# Altium integrated library connecteur 4.IntLib: 120 symbols
Pins are listed as number, name and electrical type; pins without a type are passive.

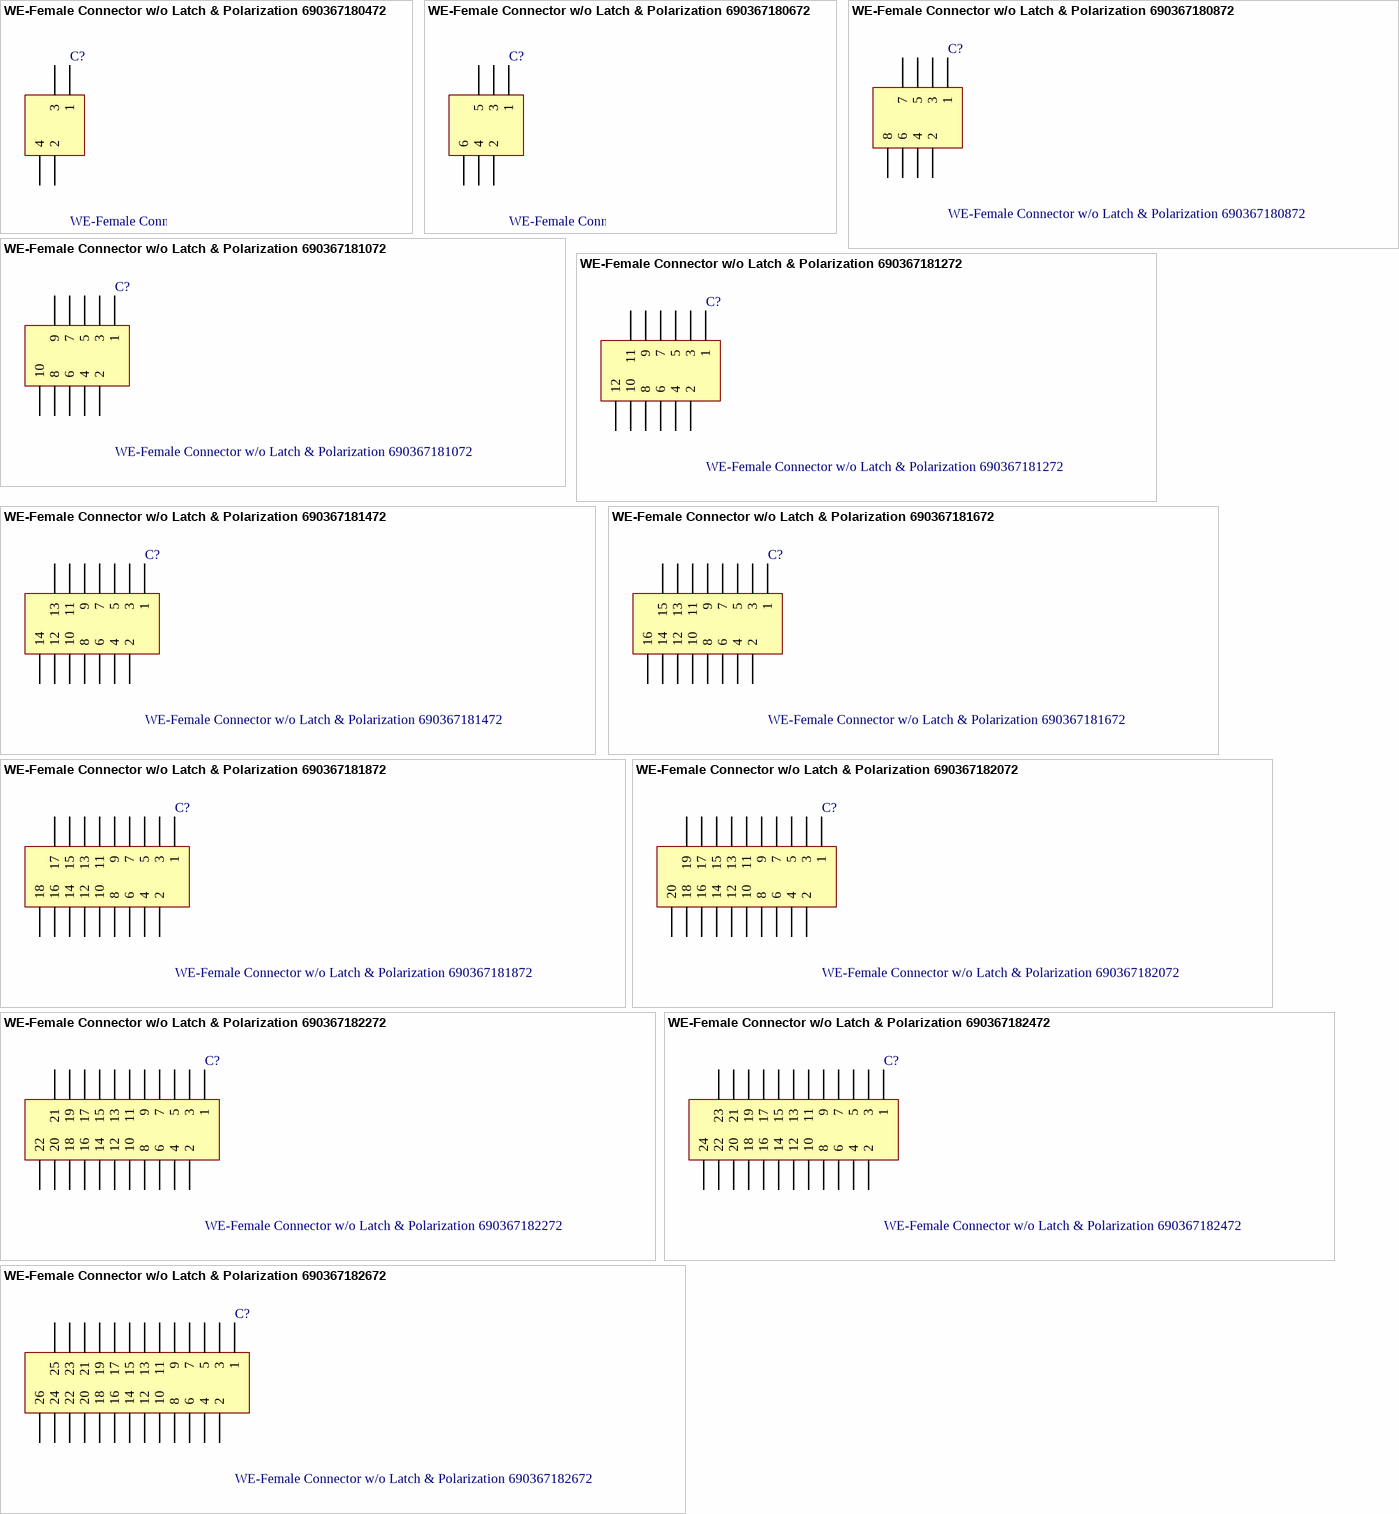
[diagram p0: symbols WE-Female Connector w/o Latch & Polarization 690367180472 to WE-Female Connector w/o Latch & Polarization 690367182672]

## WE-Female Connector w/o Latch & Polarization 690367180472
designator C?
WR-MM Female Connector w/o Latch & Polarization; Manufacturer: Würth Elektronik eiSos GmbH; ComponentLink1 Description: Manufacturer; ComponentLink2 Description: Datasheet; NoPins: 4; Created Date: 17 April 2013; partNo: 690367180472; ComponentLink1URL: http://www.we-online.com; ComponentLink2URL: http://katalog.we-online.de/em/datasheet/69036718xx72.pdf; Created by: Karrer Zheng
footprint 690367180472 (4 pins, straight)
pins: 1, 2, 3, 4

## WE-Female Connector w/o Latch & Polarization 690367180672
designator C?
WR-MM Female Connector w/o Latch & Polarization; Manufacturer: Würth Elektronik eiSos GmbH; ComponentLink1 Description: Manufacturer; ComponentLink2 Description: Datasheet; NoPins: 6; Created Date: 17 April 2013; partNo: 690367180672; ComponentLink1URL: http://www.we-online.com; ComponentLink2URL: http://katalog.we-online.de/em/datasheet/69036718xx72.pdf; Created by: Karrer Zheng
footprint 690367180672 (6 pins, straight)
pins: 1, 2, 3, 4, 5, 6

## WE-Female Connector w/o Latch & Polarization 690367180872
designator C?
WR-MM Female Connector w/o Latch & Polarization; Manufacturer: Würth Elektronik eiSos GmbH; ComponentLink1 Description: Manufacturer; ComponentLink2 Description: Datasheet; NoPins: 8; Created Date: 17 April 2013; partNo: 690367180872; ComponentLink1URL: http://www.we-online.com; ComponentLink2URL: http://katalog.we-online.de/em/datasheet/69036718xx72.pdf; Created by: Karrer Zheng
footprint 690367180872 (8 pins, straight)
pins: 1, 2, 3, 4, 5, 6, 7, 8

## WE-Female Connector w/o Latch & Polarization 690367181072
designator C?
WR-MM Female Connector w/o Latch & Polarization; Manufacturer: Würth Elektronik eiSos GmbH; ComponentLink1 Description: Manufacturer; ComponentLink2 Description: Datasheet; NoPins: 10; Created Date: 17 April 2013; partNo: 690367181072; ComponentLink1URL: http://www.we-online.com; ComponentLink2URL: http://katalog.we-online.de/em/datasheet/69036718xx72.pdf; Created by: Karrer Zheng
footprint 690367181072 (10 pins, straight)
pins: 1, 2, 3, 4, 5, 6, 7, 8, 9, 10

## WE-Female Connector w/o Latch & Polarization 690367181272
designator C?
WR-MM Female Connector w/o Latch & Polarization; Manufacturer: Würth Elektronik eiSos GmbH; ComponentLink1 Description: Manufacturer; ComponentLink2 Description: Datasheet; NoPins: 12; Created Date: 17 April 2013; partNo: 690367181272; ComponentLink1URL: http://www.we-online.com; ComponentLink2URL: http://katalog.we-online.de/em/datasheet/69036718xx72.pdf; Created by: Karrer Zheng
footprint 690367181272 (12 pins, straight)
pins: 1, 2, 3, 4, 5, 6, 7, 8, 9, 10, 11, 12

## WE-Female Connector w/o Latch & Polarization 690367181472
designator C?
WR-MM Female Connector w/o Latch & Polarization; Manufacturer: Würth Elektronik eiSos GmbH; ComponentLink1 Description: Manufacturer; ComponentLink2 Description: Datasheet; NoPins: 14; Created Date: 17 April 2013; partNo: 690367181472; ComponentLink1URL: http://www.we-online.com; ComponentLink2URL: http://katalog.we-online.de/em/datasheet/69036718xx72.pdf; Created by: Karrer Zheng
footprint 690367181472 (14 pins, straight)
pins: 1, 2, 3, 4, 5, 6, 7, 8, 9, 10, 11, 12, 13, 14

## WE-Female Connector w/o Latch & Polarization 690367181672
designator C?
WR-MM Female Connector w/o Latch & Polarization; Manufacturer: Würth Elektronik eiSos GmbH; ComponentLink1 Description: Manufacturer; ComponentLink2 Description: Datasheet; NoPins: 16; Created Date: 17 April 2013; partNo: 690367181672; ComponentLink1URL: http://www.we-online.com; ComponentLink2URL: http://katalog.we-online.de/em/datasheet/69036718xx72.pdf; Created by: Karrer Zheng
footprint 690367181672 (16 pins, straight)
pins: 1, 2, 3, 4, 5, 6, 7, 8, 9, 10, 11, 12, 13, 14, 15, 16

## WE-Female Connector w/o Latch & Polarization 690367181872
designator C?
WR-MM Female Connector w/o Latch & Polarization; Manufacturer: Würth Elektronik eiSos GmbH; ComponentLink1 Description: Manufacturer; ComponentLink2 Description: Datasheet; NoPins: 18; Created Date: 17 April 2013; partNo: 690367181872; ComponentLink1URL: http://www.we-online.com; ComponentLink2URL: http://katalog.we-online.de/em/datasheet/69036718xx72.pdf; Created by: Karrer Zheng
footprint 690367181872 (18 pins, straight)
pins: 1, 2, 3, 4, 5, 6, 7, 8, 9, 10, 11, 12, 13, 14, 15, 16, 17, 18

## WE-Female Connector w/o Latch & Polarization 690367182072
designator C?
WR-MM Female Connector w/o Latch & Polarization; Manufacturer: Würth Elektronik eiSos GmbH; ComponentLink1 Description: Manufacturer; ComponentLink2 Description: Datasheet; NoPins: 20; Created Date: 17 April 2013; partNo: 690367182072; ComponentLink1URL: http://www.we-online.com; ComponentLink2URL: http://katalog.we-online.de/em/datasheet/69036718xx72.pdf; Created by: Karrer Zheng
footprint 690367182072 (20 pins, straight)
pins: 1, 2, 3, 4, 5, 6, 7, 8, 9, 10, 11, 12, 13, 14, 15, 16, 17, 18, 19, 20

## WE-Female Connector w/o Latch & Polarization 690367182272
designator C?
WR-MM Female Connector w/o Latch & Polarization; Manufacturer: Würth Elektronik eiSos GmbH; ComponentLink1 Description: Manufacturer; ComponentLink2 Description: Datasheet; NoPins: 22; Created Date: 17 April 2013; partNo: 690367182272; ComponentLink1URL: http://www.we-online.com; ComponentLink2URL: http://katalog.we-online.de/em/datasheet/69036718xx72.pdf; Created by: Karrer Zheng
footprint 690367182272 (22 pins, straight)
pins: 1, 2, 3, 4, 5, 6, 7, 8, 9, 10, 11, 12, 13, 14, 15, 16, 17, 18, 19, 20, 21, 22

## WE-Female Connector w/o Latch & Polarization 690367182472
designator C?
WR-MM Female Connector w/o Latch & Polarization; Manufacturer: Würth Elektronik eiSos GmbH; ComponentLink1 Description: Manufacturer; ComponentLink2 Description: Datasheet; NoPins: 24; Created Date: 17 April 2013; partNo: 690367182472; ComponentLink1URL: http://www.we-online.com; ComponentLink2URL: http://katalog.we-online.de/em/datasheet/69036718xx72.pdf; Created by: Karrer Zheng
footprint 690367182472 (24 pins, straight)
pins: 1, 2, 3, 4, 5, 6, 7, 8, 9, 10, 11, 12, 13, 14, 15, 16, 17, 18, 19, 20, 21, 22, 23, 24

## WE-Female Connector w/o Latch & Polarization 690367182672
designator C?
WR-MM Female Connector w/o Latch & Polarization; Manufacturer: Würth Elektronik eiSos GmbH; ComponentLink1 Description: Manufacturer; ComponentLink2 Description: Datasheet; NoPins: 26; Created Date: 17 April 2013; partNo: 690367182672; ComponentLink1URL: http://www.we-online.com; ComponentLink2URL: http://katalog.we-online.de/em/datasheet/69036718xx72.pdf; Created by: Karrer Zheng
footprint 690367182672 (26 pins, straight)
pins: 1, 2, 3, 4, 5, 6, 7, 8, 9, 10, 11, 12, 13, 14, 15, 16, 17, 18, 19, 20, 21, 22, 23, 24, 25, 26


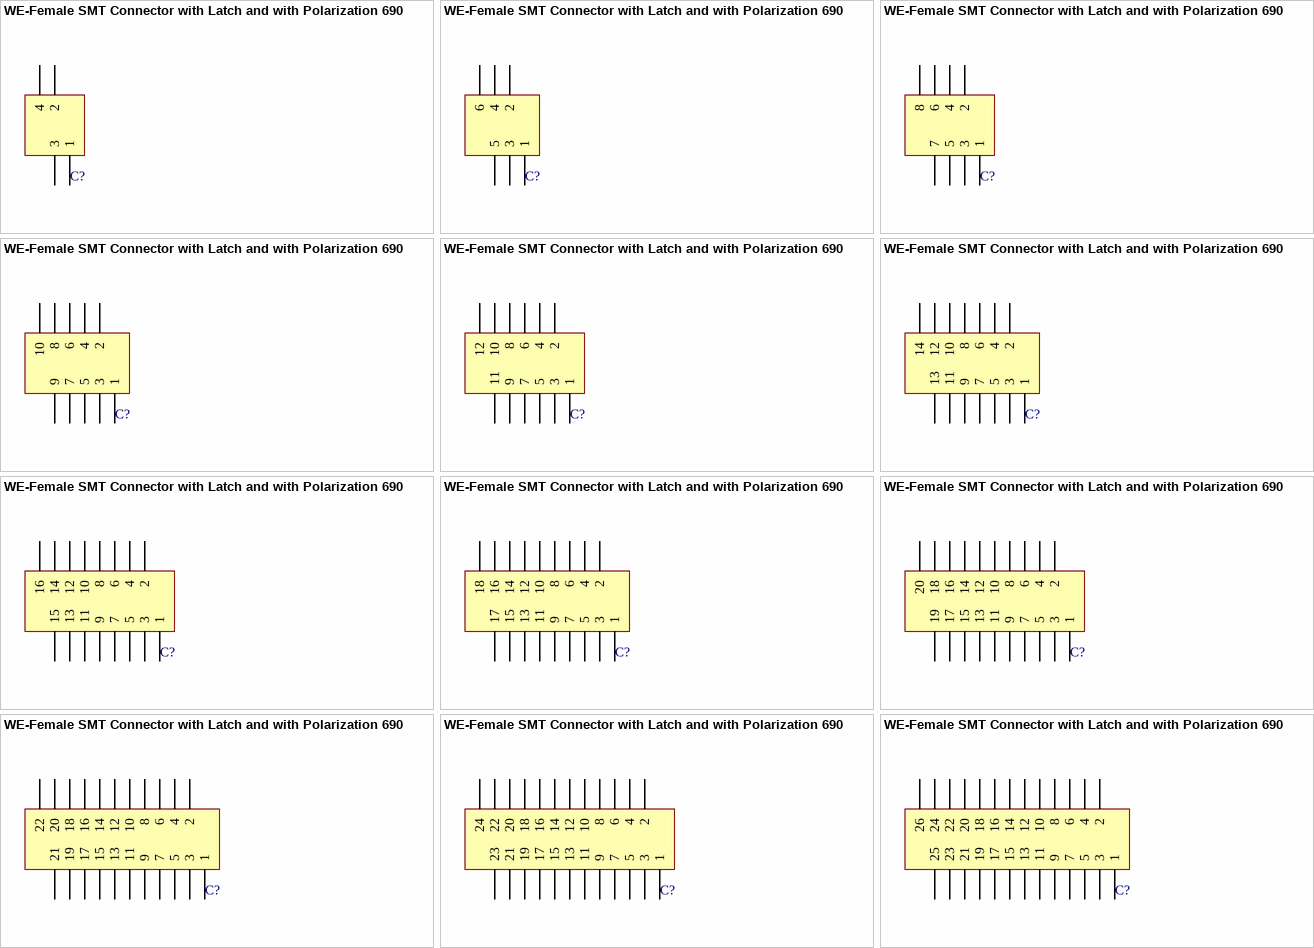
[diagram p1: symbols WE-Female SMT Connector with Latch and with Polarization 690367290476 to WE-Female SMT Connector with Latch and with Polarization 690367292676]

## WE-Female SMT Connector with Latch and with Polarization 690367290476
designator C?
WR-MM Female SMT Connector with Latch; Manufacturer: Würth Elektronik eiSos GmbH; ComponentLink1 Description: Manufacturer; ComponentLink2 Description: Datasheet; NoPins: 4; Created Date: 16 April 2013; partNo: 690367290476; ComponentLink1URL: http://www.we-online.com; ComponentLink2URL: http://katalog.we-online.de/em/datasheet/69036729xx76.pdf; Created by: Karrer Zheng
footprint 690367290476 (and Polarization, 4 pins, SMT, straight)
pins: 1, 2, 3, 4

## WE-Female SMT Connector with Latch and with Polarization 690367290676
designator C?
WR-MM Female SMT Connector with Latch; Manufacturer: Würth Elektronik eiSos GmbH; ComponentLink1 Description: Manufacturer; ComponentLink2 Description: Datasheet; NoPins: 06; Created Date: 16 April 2013; partNo: 690367290676; ComponentLink1URL: http://www.we-online.com; ComponentLink2URL: http://katalog.we-online.de/em/datasheet/69036729xx76.pdf; Created by: Karrer Zheng
footprint 690367290676 (and Polarization, 6 pins, SMT, straight)
pins: 1, 2, 3, 4, 5, 6

## WE-Female SMT Connector with Latch and with Polarization 690367290876
designator C?
WR-MM Female SMT Connector with Latch; Manufacturer: Würth Elektronik eiSos GmbH; ComponentLink1 Description: Manufacturer; ComponentLink2 Description: Datasheet; NoPins: 08; Created Date: 16 April 2013; partNo: 690367290876; ComponentLink1URL: http://www.we-online.com; ComponentLink2URL: http://katalog.we-online.de/em/datasheet/69036729xx76.pdf; Created by: Karrer Zheng
footprint 690367290876 (and Polarization, 8 pins, SMT, straight)
pins: 1, 2, 3, 4, 5, 6, 7, 8

## WE-Female SMT Connector with Latch and with Polarization 690367291076
designator C?
WR-MM Female SMT Connector with Latch; Manufacturer: Würth Elektronik eiSos GmbH; ComponentLink1 Description: Manufacturer; ComponentLink2 Description: Datasheet; NoPins: 10; Created Date: 16 April 2013; partNo: 690367291076; ComponentLink1URL: http://www.we-online.com; ComponentLink2URL: http://katalog.we-online.de/em/datasheet/69036729xx76.pdf; Created by: Karrer Zheng
footprint 690367291076 (and Polarization, 10 pins, SMT, straight)
pins: 1, 2, 3, 4, 5, 6, 7, 8, 9, 10

## WE-Female SMT Connector with Latch and with Polarization 690367291276
designator C?
WR-MM Female SMT Connector with Latch; Manufacturer: Würth Elektronik eiSos GmbH; ComponentLink1 Description: Manufacturer; ComponentLink2 Description: Datasheet; NoPins: 12; Created Date: 16 April 2013; partNo: 690367291276; ComponentLink1URL: http://www.we-online.com; ComponentLink2URL: http://katalog.we-online.de/em/datasheet/69036729xx76.pdf; Created by: Karrer Zheng
footprint 690367291276 (and Polarization, 12 pins, SMT, straight)
pins: 1, 2, 3, 4, 5, 6, 7, 8, 9, 10, 11, 12

## WE-Female SMT Connector with Latch and with Polarization 690367291476
designator C?
WR-MM Female SMT Connector with Latch; Manufacturer: Würth Elektronik eiSos GmbH; ComponentLink1 Description: Manufacturer; ComponentLink2 Description: Datasheet; NoPins: 14; Created Date: 16 April 2013; partNo: 690367291476; ComponentLink1URL: http://www.we-online.com; ComponentLink2URL: http://katalog.we-online.de/em/datasheet/69036729xx76.pdf; Created by: Karrer Zheng
footprint 690367291476 (and Polarization, 14 pins, SMT, straight)
pins: 1, 2, 3, 4, 5, 6, 7, 8, 9, 10, 11, 12, 13, 14

## WE-Female SMT Connector with Latch and with Polarization 690367291676
designator C?
WR-MM Female SMT Connector with Latch; Manufacturer: Würth Elektronik eiSos GmbH; ComponentLink1 Description: Manufacturer; ComponentLink2 Description: Datasheet; NoPins: 16; Created Date: 16 April 2013; partNo: 690367291676; ComponentLink1URL: http://www.we-online.com; ComponentLink2URL: http://katalog.we-online.de/em/datasheet/69036729xx76.pdf; Created by: Karrer Zheng
footprint 690367291676 (and Polarization, 16 pins, SMT, straight)
pins: 1, 2, 3, 4, 5, 6, 7, 8, 9, 10, 11, 12, 13, 14, 15, 16

## WE-Female SMT Connector with Latch and with Polarization 690367291876
designator C?
WR-MM Female SMT Connector with Latch; Manufacturer: Würth Elektronik eiSos GmbH; ComponentLink1 Description: Manufacturer; ComponentLink2 Description: Datasheet; NoPins: 18; Created Date: 16 April 2013; partNo: 690367291876; ComponentLink1URL: http://www.we-online.com; ComponentLink2URL: http://katalog.we-online.de/em/datasheet/69036729xx76.pdf; Created by: Karrer Zheng
footprint 690367291876 (and Polarization, 18 pins, SMT, straight)
pins: 1, 2, 3, 4, 5, 6, 7, 8, 9, 10, 11, 12, 13, 14, 15, 16, 17, 18

## WE-Female SMT Connector with Latch and with Polarization 690367292076
designator C?
WR-MM Female SMT Connector with Latch; Manufacturer: Würth Elektronik eiSos GmbH; ComponentLink1 Description: Manufacturer; ComponentLink2 Description: Datasheet; NoPins: 20; Created Date: 16 April 2013; partNo: 690367292076; ComponentLink1URL: http://www.we-online.com; ComponentLink2URL: http://katalog.we-online.de/em/datasheet/69036729xx76.pdf; Created by: Karrer Zheng
footprint 690367292076 (and Polarization, 20 pins, SMT, straight)
pins: 1, 2, 3, 4, 5, 6, 7, 8, 9, 10, 11, 12, 13, 14, 15, 16, 17, 18, 19, 20

## WE-Female SMT Connector with Latch and with Polarization 690367292276
designator C?
WR-MM Female SMT Connector with Latch; Manufacturer: Würth Elektronik eiSos GmbH; ComponentLink1 Description: Manufacturer; ComponentLink2 Description: Datasheet; NoPins: 22; Created Date: 16 April 2013; partNo: 690367292276; ComponentLink1URL: http://www.we-online.com; ComponentLink2URL: http://katalog.we-online.de/em/datasheet/69036729xx76.pdf; Created by: Karrer Zheng
footprint 690367292276 (and Polarization, 22 pins, SMT, straight)
pins: 1, 2, 3, 4, 5, 6, 7, 8, 9, 10, 11, 12, 13, 14, 15, 16, 17, 18, 19, 20, 21, 22

## WE-Female SMT Connector with Latch and with Polarization 690367292476
designator C?
WR-MM Female SMT Connector with Latch; Manufacturer: Würth Elektronik eiSos GmbH; ComponentLink1 Description: Manufacturer; ComponentLink2 Description: Datasheet; NoPins: 24; Created Date: 16 April 2013; partNo: 690367292476; ComponentLink1URL: http://www.we-online.com; ComponentLink2URL: http://katalog.we-online.de/em/datasheet/69036729xx76.pdf; Created by: Karrer Zheng
footprint 690367292476 (and Polarization, 24 pins, SMT, straight)
pins: 1, 2, 3, 4, 5, 6, 7, 8, 9, 10, 11, 12, 13, 14, 15, 16, 17, 18, 19, 20, 21, 22, 23, 24

## WE-Female SMT Connector with Latch and with Polarization 690367292676
designator C?
WR-MM Female SMT Connector with Latch; Manufacturer: Würth Elektronik eiSos GmbH; ComponentLink1 Description: Manufacturer; ComponentLink2 Description: Datasheet; NoPins: 26; Created Date: 16 April 2013; partNo: 690367292676; ComponentLink1URL: http://www.we-online.com; ComponentLink2URL: http://katalog.we-online.de/em/datasheet/69036729xx76.pdf; Created by: Karrer Zheng
footprint 690367292676 (and Polarization, 26 pins, SMT, straight)
pins: 1, 2, 3, 4, 5, 6, 7, 8, 9, 10, 11, 12, 13, 14, 15, 16, 17, 18, 19, 20, 21, 22, 23, 24, 25, 26


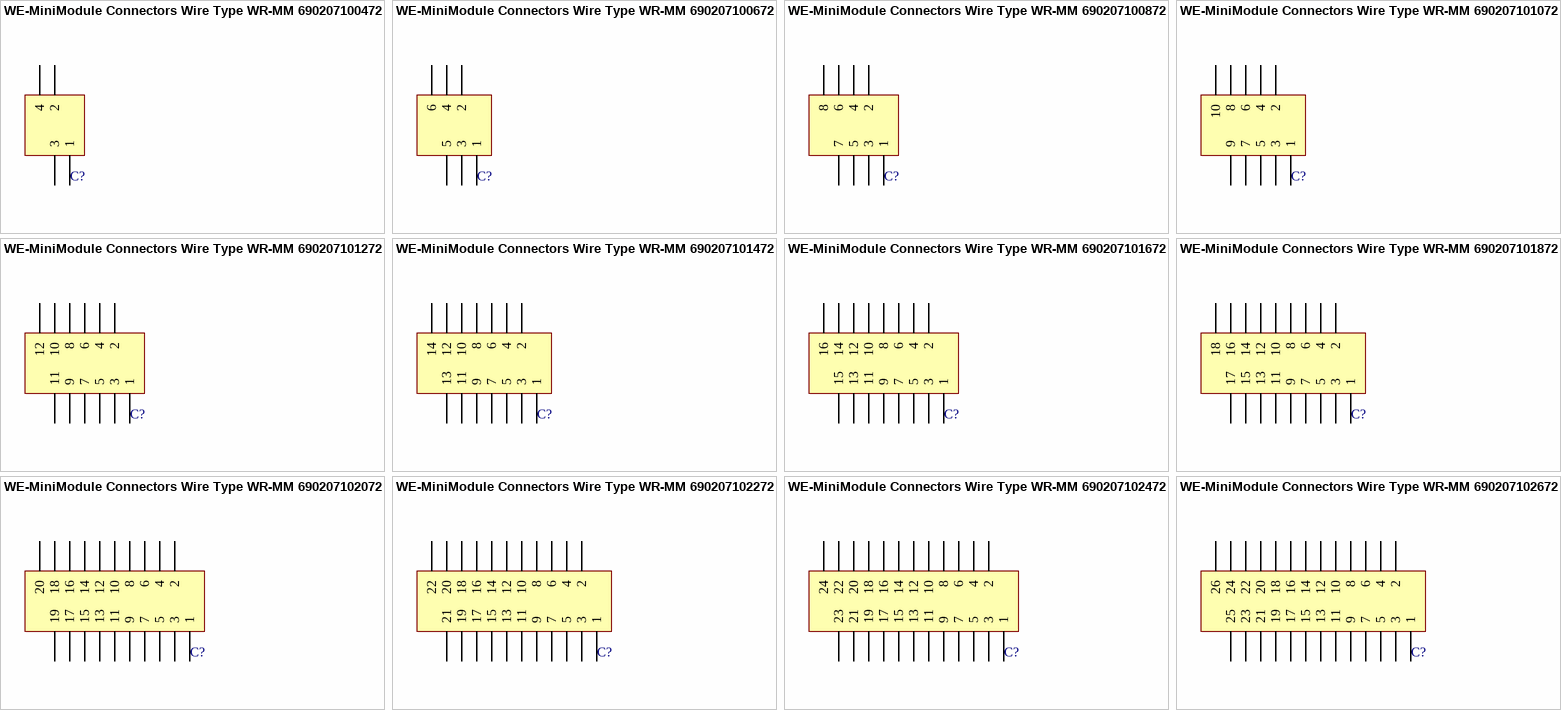
[diagram p2: symbols WE-MiniModule Connectors Wire Type WR-MM 690207100472 to WE-MiniModule Connectors Wire Type WR-MM 690207102672]

## WE-MiniModule Connectors Wire Type WR-MM 690207100472
designator C?
WR-MM Transition Connector; Manufacturer: Würth Elektronik eiSos GmbH; ComponentLink1 Description: Manufacturer; ComponentLink2 Description: Datasheet; NoPins: 4; Created Date: 19 April 2013; partNo: 690207100472; ComponentLink1URL: http://www.we-online.com; ComponentLink2URL: http://katalog.we-online.de/em/datasheet/69020710xx72.pdf; Created by: Karrer Zheng
footprint 690207100472 (4 pins)
pins: 1, 2, 3, 4

## WE-MiniModule Connectors Wire Type WR-MM 690207100672
designator C?
WR-MM Transition Connector; Manufacturer: Würth Elektronik eiSos GmbH; ComponentLink1 Description: Manufacturer; ComponentLink2 Description: Datasheet; NoPins: 6; Created Date: 19 April 2013; partNo: 690207100672; ComponentLink1URL: http://www.we-online.com; ComponentLink2URL: http://katalog.we-online.de/em/datasheet/69020710xx72.pdf; Created by: Karrer Zheng
footprint 690207100672 (6 pins)
pins: 1, 2, 3, 4, 5, 6

## WE-MiniModule Connectors Wire Type WR-MM 690207100872
designator C?
WR-MM Transition Connector; Manufacturer: Würth Elektronik eiSos GmbH; ComponentLink1 Description: Manufacturer; ComponentLink2 Description: Datasheet; NoPins: 8; Created Date: 19 April 2013; partNo: 690207100872; ComponentLink1URL: http://www.we-online.com; ComponentLink2URL: http://katalog.we-online.de/em/datasheet/69020710xx72.pdf; Created by: Karrer Zheng
footprint 690207100872 (8 pins)
pins: 1, 2, 3, 4, 5, 6, 7, 8

## WE-MiniModule Connectors Wire Type WR-MM 690207101072
designator C?
WR-MM Transition Connector; Manufacturer: Würth Elektronik eiSos GmbH; ComponentLink1 Description: Manufacturer; ComponentLink2 Description: Datasheet; NoPins: 10; Created Date: 19 April 2013; partNo: 690207101072; ComponentLink1URL: http://www.we-online.com; ComponentLink2URL: http://katalog.we-online.de/em/datasheet/69020710xx72.pdf; Created by: Karrer Zheng
footprint 690207101072 (10 pins)
pins: 1, 2, 3, 4, 5, 6, 7, 8, 9, 10

## WE-MiniModule Connectors Wire Type WR-MM 690207101272
designator C?
WR-MM Transition Connector; Manufacturer: Würth Elektronik eiSos GmbH; ComponentLink1 Description: Manufacturer; ComponentLink2 Description: Datasheet; NoPins: 12; Created Date: 19 April 2013; partNo: 690207101272; ComponentLink1URL: http://www.we-online.com; ComponentLink2URL: http://katalog.we-online.de/em/datasheet/69020710xx72.pdf; Created by: Karrer Zheng
footprint 690207101272 (12 pins)
pins: 1, 2, 3, 4, 5, 6, 7, 8, 9, 10, 11, 12

## WE-MiniModule Connectors Wire Type WR-MM 690207101472
designator C?
WR-MM Transition Connector; Manufacturer: Würth Elektronik eiSos GmbH; ComponentLink1 Description: Manufacturer; ComponentLink2 Description: Datasheet; NoPins: 14; Created Date: 19 April 2013; partNo: 690207101472; ComponentLink1URL: http://www.we-online.com; ComponentLink2URL: http://katalog.we-online.de/em/datasheet/69020710xx72.pdf; Created by: Karrer Zheng
footprint 690207101472 (14 pins)
pins: 1, 2, 3, 4, 5, 6, 7, 8, 9, 10, 11, 12, 13, 14

## WE-MiniModule Connectors Wire Type WR-MM 690207101672
designator C?
WR-MM Transition Connector; Manufacturer: Würth Elektronik eiSos GmbH; ComponentLink1 Description: Manufacturer; ComponentLink2 Description: Datasheet; NoPins: 16; Created Date: 19 April 2013; partNo: 690207101672; ComponentLink1URL: http://www.we-online.com; ComponentLink2URL: http://katalog.we-online.de/em/datasheet/69020710xx72.pdf; Created by: Karrer Zheng
footprint 690207101672 (16 pins)
pins: 1, 2, 3, 4, 5, 6, 7, 8, 9, 10, 11, 12, 13, 14, 15, 16

## WE-MiniModule Connectors Wire Type WR-MM 690207101872
designator C?
WR-MM Transition Connector; Manufacturer: Würth Elektronik eiSos GmbH; ComponentLink1 Description: Manufacturer; ComponentLink2 Description: Datasheet; NoPins: 18; Created Date: 19 April 2013; partNo: 690207101872; ComponentLink1URL: http://www.we-online.com; ComponentLink2URL: http://katalog.we-online.de/em/datasheet/69020710xx72.pdf; Created by: Karrer Zheng
footprint 690207101872 (18 pins)
pins: 1, 2, 3, 4, 5, 6, 7, 8, 9, 10, 11, 12, 13, 14, 15, 16, 17, 18

## WE-MiniModule Connectors Wire Type WR-MM 690207102072
designator C?
WR-MM Transition Connector; Manufacturer: Würth Elektronik eiSos GmbH; ComponentLink1 Description: Manufacturer; ComponentLink2 Description: Datasheet; NoPins: 20; Created Date: 19 April 2013; partNo: 690207102072; ComponentLink1URL: http://www.we-online.com; ComponentLink2URL: http://katalog.we-online.de/em/datasheet/69020710xx72.pdf; Created by: Karrer Zheng
footprint 690207102072 (20 pins)
pins: 1, 2, 3, 4, 5, 6, 7, 8, 9, 10, 11, 12, 13, 14, 15, 16, 17, 18, 19, 20

## WE-MiniModule Connectors Wire Type WR-MM 690207102272
designator C?
WR-MM Transition Connector; Manufacturer: Würth Elektronik eiSos GmbH; ComponentLink1 Description: Manufacturer; ComponentLink2 Description: Datasheet; NoPins: 22; Created Date: 19 April 2013; partNo: 690207102272; ComponentLink1URL: http://www.we-online.com; ComponentLink2URL: http://katalog.we-online.de/em/datasheet/69020710xx72.pdf; Created by: Karrer Zheng
footprint 690207102272 (22 pins)
pins: 1, 2, 3, 4, 5, 6, 7, 8, 9, 10, 11, 12, 13, 14, 15, 16, 17, 18, 19, 20, 21, 22

## WE-MiniModule Connectors Wire Type WR-MM 690207102472
designator C?
WR-MM Transition Connector; Manufacturer: Würth Elektronik eiSos GmbH; ComponentLink1 Description: Manufacturer; ComponentLink2 Description: Datasheet; NoPins: 24; Created Date: 19 April 2013; partNo: 690207102472; ComponentLink1URL: http://www.we-online.com; ComponentLink2URL: http://katalog.we-online.de/em/datasheet/69020710xx72.pdf; Created by: Karrer Zheng
footprint 690207102472 (24 pins)
pins: 1, 2, 3, 4, 5, 6, 7, 8, 9, 10, 11, 12, 13, 14, 15, 16, 17, 18, 19, 20, 21, 22, 23, 24

## WE-MiniModule Connectors Wire Type WR-MM 690207102672
designator C?
WR-MM Transition Connector; Manufacturer: Würth Elektronik eiSos GmbH; ComponentLink1 Description: Manufacturer; ComponentLink2 Description: Datasheet; NoPins: 26; Created Date: 19 April 2013; partNo: 690207102672; ComponentLink1URL: http://www.we-online.com; ComponentLink2URL: http://katalog.we-online.de/em/datasheet/69020710xx72.pdf; Created by: Karrer Zheng
footprint 690207102672 (26 pins)
pins: 1, 2, 3, 4, 5, 6, 7, 8, 9, 10, 11, 12, 13, 14, 15, 16, 17, 18, 19, 20, 21, 22, 23, 24, 25, 26


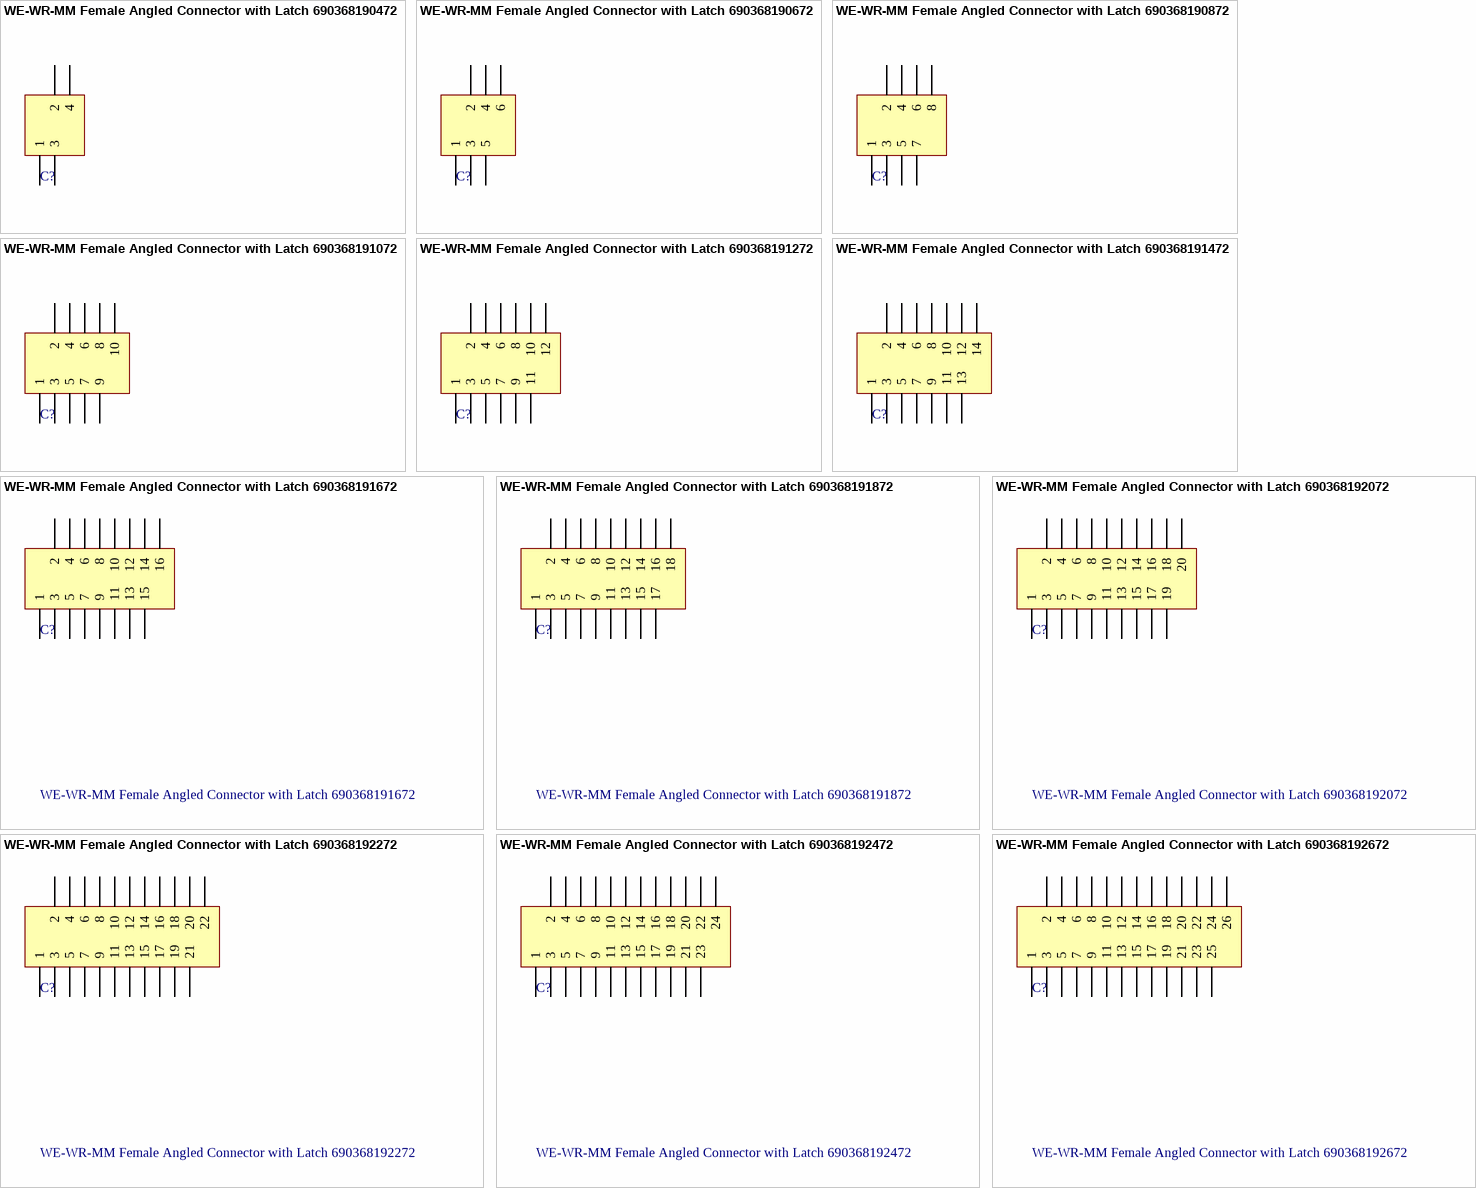
[diagram p3: symbols WE-WR-MM Female Angled Connector with Latch 690368190472 to WE-WR-MM Female Angled Connector with Latch 690368192672]

## WE-WR-MM Female Angled Connector with Latch 690368190472
designator C?
WR-MM Female Angled Connector with Latch; Manufacturer: Würth Elektronik eiSos GmbH; ComponentLink1 Description: Manufacturer; ComponentLink2 Description: Datasheet; NoPins: 4; Created Date: 18 April 2013; partNo: 690368190472; ComponentLink1URL: http://www.we-online.com; ComponentLink2URL: http://katalog.we-online.de/em/datasheet/69036819xx72.pdf; Created by: Karrer Zheng
footprint 690368190472 (and Polarization, 4 pins, right angled)
pins: 1, 2, 3, 4

## WE-WR-MM Female Angled Connector with Latch 690368190672
designator C?
WR-MM Female Angled Connector with Latch; Manufacturer: Würth Elektronik eiSos GmbH; ComponentLink1 Description: Manufacturer; ComponentLink2 Description: Datasheet; NoPins: 6; Created Date: 18 April 2013; partNo: 690368190672; ComponentLink1URL: http://www.we-online.com; ComponentLink2URL: http://katalog.we-online.de/em/datasheet/69036819xx72.pdf; Created by: Karrer Zheng
footprint 690368190672 (and Polarization, 6 pins, right angled)
pins: 1, 2, 3, 4, 5, 6

## WE-WR-MM Female Angled Connector with Latch 690368190872
designator C?
WR-MM Female Angled Connector with Latch; Manufacturer: Würth Elektronik eiSos GmbH; ComponentLink1 Description: Manufacturer; ComponentLink2 Description: Datasheet; NoPins: 8; Created Date: 18 April 2013; partNo: 690368190872; ComponentLink1URL: http://www.we-online.com; ComponentLink2URL: http://katalog.we-online.de/em/datasheet/69036819xx72.pdf; Created by: Karrer Zheng
footprint 690368190872 (and Polarization, 8 pins, right angled)
pins: 1, 2, 3, 4, 5, 6, 7, 8

## WE-WR-MM Female Angled Connector with Latch 690368191072
designator C?
WR-MM Female Angled Connector with Latch; Manufacturer: Würth Elektronik eiSos GmbH; ComponentLink1 Description: Manufacturer; ComponentLink2 Description: Datasheet; NoPins: 10; Created Date: 18 April 2013; partNo: 690368191072; ComponentLink1URL: http://www.we-online.com; ComponentLink2URL: http://katalog.we-online.de/em/datasheet/69036819xx72.pdf; Created by: Karrer Zheng
footprint 690368191072 (and Polarization, 10 pins, right angled)
pins: 1, 2, 3, 4, 5, 6, 7, 8, 9, 10

## WE-WR-MM Female Angled Connector with Latch 690368191272
designator C?
WR-MM Female Angled Connector with Latch; Manufacturer: Würth Elektronik eiSos GmbH; ComponentLink1 Description: Manufacturer; ComponentLink2 Description: Datasheet; NoPins: 12; Created Date: 18 April 2013; partNo: 690368191272; ComponentLink1URL: http://www.we-online.com; ComponentLink2URL: http://katalog.we-online.de/em/datasheet/69036819xx72.pdf; Created by: Karrer Zheng
footprint 690368191272 (and Polarization, 12 pins, right angled)
pins: 1, 2, 3, 4, 5, 6, 7, 8, 9, 10, 11, 12

## WE-WR-MM Female Angled Connector with Latch 690368191472
designator C?
WR-MM Female Angled Connector with Latch; Manufacturer: Würth Elektronik eiSos GmbH; ComponentLink1 Description: Manufacturer; ComponentLink2 Description: Datasheet; NoPins: 14; Created Date: 18 April 2013; partNo: 690368191472; ComponentLink1URL: http://www.we-online.com; ComponentLink2URL: http://katalog.we-online.de/em/datasheet/69036819xx72.pdf; Created by: Karrer Zheng
footprint 690368191472 (and Polarization, 14 pins, right angled)
pins: 1, 2, 3, 4, 5, 6, 7, 8, 9, 10, 11, 12, 13, 14

## WE-WR-MM Female Angled Connector with Latch 690368191672
designator C?
WR-MM Female Angled Connector with Latch; Manufacturer: Würth Elektronik eiSos GmbH; ComponentLink1 Description: Manufacturer; ComponentLink2 Description: Datasheet; NoPins: 16; Created Date: 18 April 2013; partNo: 690368191672; ComponentLink1URL: http://www.we-online.com; ComponentLink2URL: http://katalog.we-online.de/em/datasheet/69036819xx72.pdf; Created by: Karrer Zheng
footprint 690368191672 (and Polarization, 16 pins, right angled)
pins: 1, 2, 3, 4, 5, 6, 7, 8, 9, 10, 11, 12, 13, 14, 15, 16

## WE-WR-MM Female Angled Connector with Latch 690368191872
designator C?
WR-MM Female Angled Connector with Latch; Manufacturer: Würth Elektronik eiSos GmbH; ComponentLink1 Description: Manufacturer; ComponentLink2 Description: Datasheet; NoPins: 18; Created Date: 18 April 2013; partNo: 690368191872; ComponentLink1URL: http://www.we-online.com; ComponentLink2URL: http://katalog.we-online.de/em/datasheet/69036819xx72.pdf; Created by: Karrer Zheng
footprint 690368191872 (and Polarization, 18 pins, right angled)
pins: 1, 2, 3, 4, 5, 6, 7, 8, 9, 10, 11, 12, 13, 14, 15, 16, 17, 18

## WE-WR-MM Female Angled Connector with Latch 690368192072
designator C?
WR-MM Female Angled Connector with Latch; Manufacturer: Würth Elektronik eiSos GmbH; ComponentLink1 Description: Manufacturer; ComponentLink2 Description: Datasheet; NoPins: 20; Created Date: 18 April 2013; partNo: 690368192072; ComponentLink1URL: http://www.we-online.com; ComponentLink2URL: http://katalog.we-online.de/em/datasheet/69036819xx72.pdf; Created by: Karrer Zheng
footprint 690368192072 (and Polarization, 20 pins, right angled)
pins: 1, 2, 3, 4, 5, 6, 7, 8, 9, 10, 11, 12, 13, 14, 15, 16, 17, 18, 19, 20

## WE-WR-MM Female Angled Connector with Latch 690368192272
designator C?
WR-MM Female Angled Connector with Latch; Manufacturer: Würth Elektronik eiSos GmbH; ComponentLink1 Description: Manufacturer; ComponentLink2 Description: Datasheet; NoPins: 22; Created Date: 18 April 2013; partNo: 690368192272; ComponentLink1URL: http://www.we-online.com; ComponentLink2URL: http://katalog.we-online.de/em/datasheet/69036819xx72.pdf; Created by: Karrer Zheng
footprint 690368192272 (and Polarization, 22 pins, right angled)
pins: 1, 2, 3, 4, 5, 6, 7, 8, 9, 10, 11, 12, 13, 14, 15, 16, 17, 18, 19, 20, 21, 22

## WE-WR-MM Female Angled Connector with Latch 690368192472
designator C?
WR-MM Female Angled Connector with Latch; Manufacturer: Würth Elektronik eiSos GmbH; ComponentLink1 Description: Manufacturer; ComponentLink2 Description: Datasheet; NoPins: 24; Created Date: 18 April 2013; partNo: 690368192472; ComponentLink1URL: http://www.we-online.com; ComponentLink2URL: http://katalog.we-online.de/em/datasheet/69036819xx72.pdf; Created by: Karrer Zheng
footprint 690368192472 (and Polarization, 24 pins, right angled)
pins: 1, 2, 3, 4, 5, 6, 7, 8, 9, 10, 11, 12, 13, 14, 15, 16, 17, 18, 19, 20, 21, 22, 23, 24

## WE-WR-MM Female Angled Connector with Latch 690368192672
designator C?
WR-MM Female Angled Connector with Latch; Manufacturer: Würth Elektronik eiSos GmbH; ComponentLink1 Description: Manufacturer; ComponentLink2 Description: Datasheet; NoPins: 26; Created Date: 18 April 2013; partNo: 690368192672; ComponentLink1URL: http://www.we-online.com; ComponentLink2URL: http://katalog.we-online.de/em/datasheet/69036819xx72.pdf; Created by: Karrer Zheng
footprint 690368192672 (and Polarization, 26 pins, right angled)
pins: 1, 2, 3, 4, 5, 6, 7, 8, 9, 10, 11, 12, 13, 14, 15, 16, 17, 18, 19, 20, 21, 22, 23, 24, 25, 26


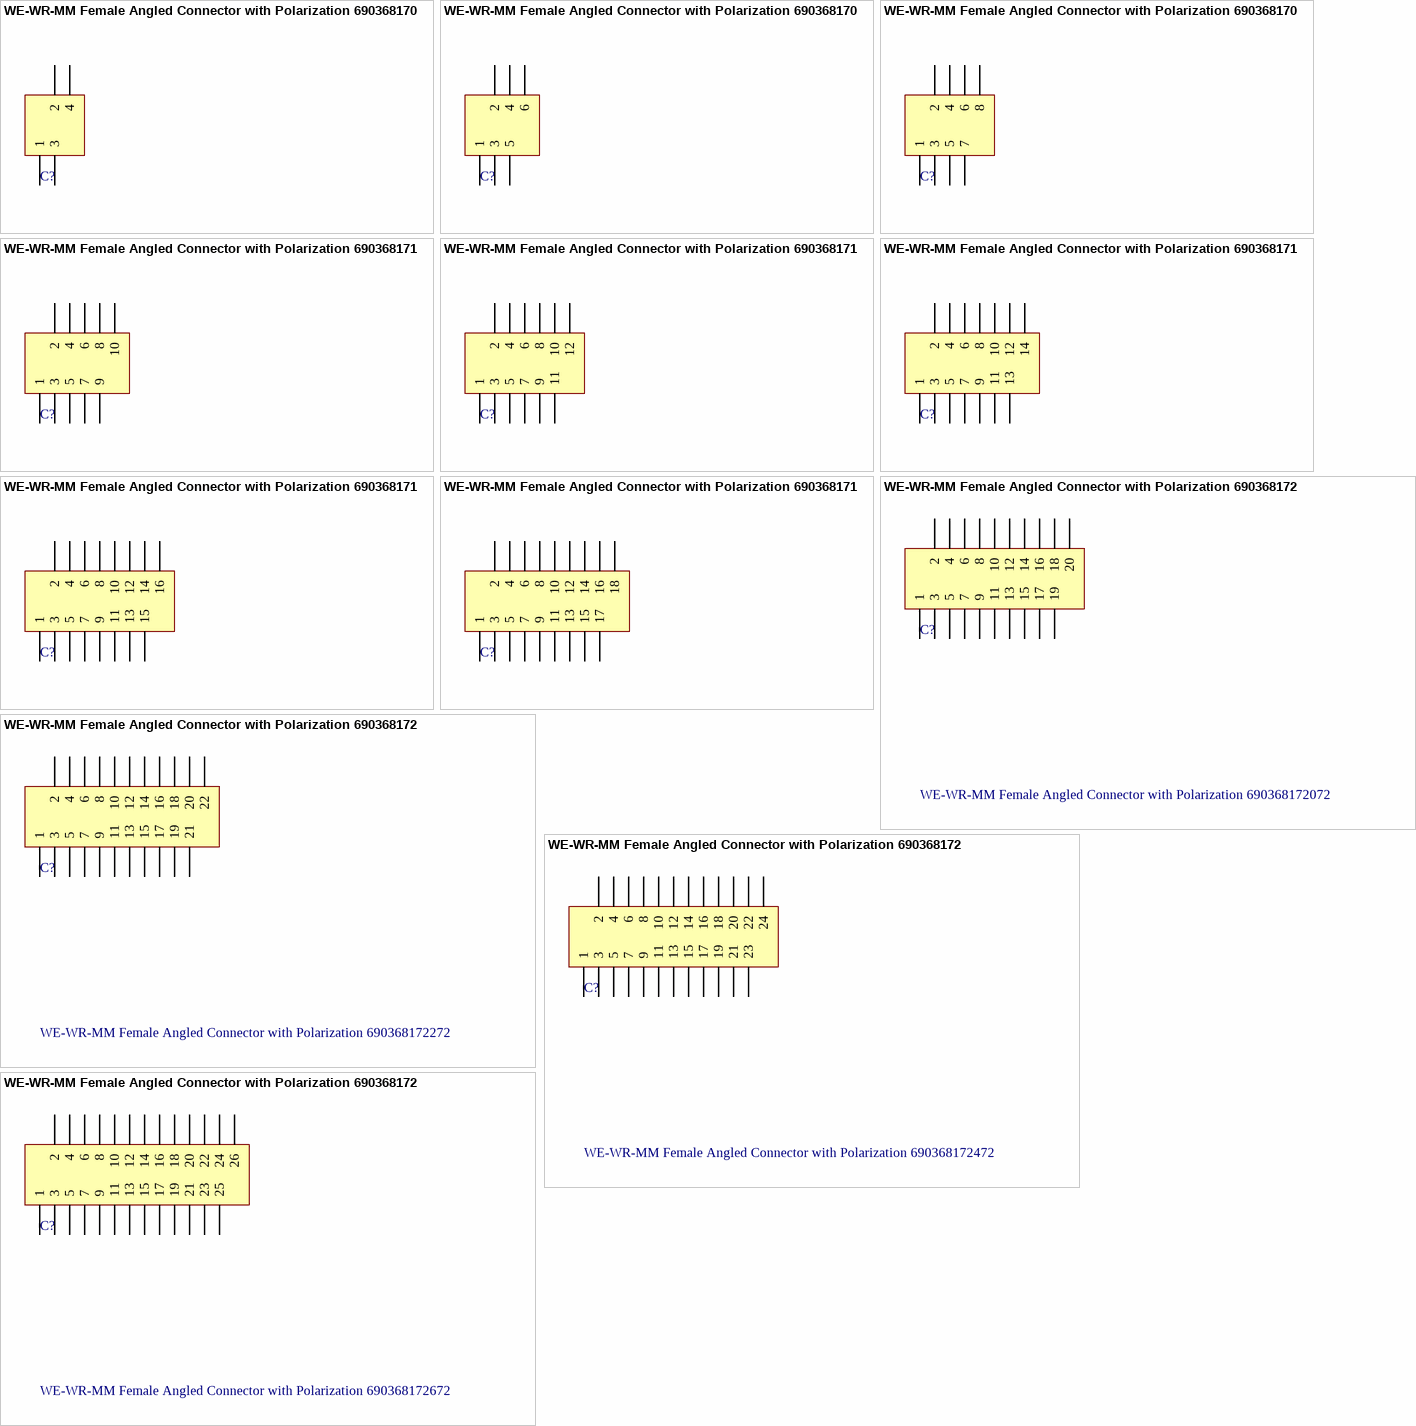
[diagram p4: symbols WE-WR-MM Female Angled Connector with Polarization 690368170472 to WE-WR-MM Female Angled Connector with Polarization 690368172672]

## WE-WR-MM Female Angled Connector with Polarization 690368170472
designator C?
WR-MM Female Angled Connector with Polarization; Manufacturer: Würth Elektronik eiSos GmbH; ComponentLink1 Description: Manufacturer; ComponentLink2 Description: Datasheet; NoPins: 4; Created Date: 18 April 2013; partNo: 690368170472; ComponentLink1URL: http://www.we-online.com; ComponentLink2URL: http://katalog.we-online.de/em/datasheet/69036817xx72.pdf; Created by: Karrer Zheng
footprint 690368170472 (without Latch, 4 pins, right angled)
pins: 1, 2, 3, 4

## WE-WR-MM Female Angled Connector with Polarization 690368170672
designator C?
WR-MM Female Angled Connector with Polarization; Manufacturer: Würth Elektronik eiSos GmbH; ComponentLink1 Description: Manufacturer; ComponentLink2 Description: Datasheet; NoPins: 6; Created Date: 18 April 2013; partNo: 690368170672; ComponentLink1URL: http://www.we-online.com; ComponentLink2URL: http://katalog.we-online.de/em/datasheet/69036817xx72.pdf; Created by: Karrer Zheng
footprint 690368170672 (without Latch, 6 pins, right angled)
pins: 1, 2, 3, 4, 5, 6

## WE-WR-MM Female Angled Connector with Polarization 690368170872
designator C?
WR-MM Female Angled Connector with Polarization; Manufacturer: Würth Elektronik eiSos GmbH; ComponentLink1 Description: Manufacturer; ComponentLink2 Description: Datasheet; NoPins: 8; Created Date: 18 April 2013; partNo: 690368170872; ComponentLink1URL: http://www.we-online.com; ComponentLink2URL: http://katalog.we-online.de/em/datasheet/69036817xx72.pdf; Created by: Karrer Zheng
footprint 690368170872 (without Latch, 8 pins, right angled)
pins: 1, 2, 3, 4, 5, 6, 7, 8

## WE-WR-MM Female Angled Connector with Polarization 690368171072
designator C?
WR-MM Female Angled Connector with Polarization; Manufacturer: Würth Elektronik eiSos GmbH; ComponentLink1 Description: Manufacturer; ComponentLink2 Description: Datasheet; NoPins: 10; Created Date: 18 April 2013; partNo: 690368171072; ComponentLink1URL: http://www.we-online.com; ComponentLink2URL: http://katalog.we-online.de/em/datasheet/69036817xx72.pdf; Created by: Karrer Zheng
footprint 690368171072 (without Latch, 10 pins, right angled)
pins: 1, 2, 3, 4, 5, 6, 7, 8, 9, 10

## WE-WR-MM Female Angled Connector with Polarization 690368171272
designator C?
WR-MM Female Angled Connector with Polarization; Manufacturer: Würth Elektronik eiSos GmbH; ComponentLink1 Description: Manufacturer; ComponentLink2 Description: Datasheet; NoPins: 12; Created Date: 18 April 2013; partNo: 690368171272; ComponentLink1URL: http://www.we-online.com; ComponentLink2URL: http://katalog.we-online.de/em/datasheet/69036817xx72.pdf; Created by: Karrer Zheng
footprint 690368171272 (without Latch, 12 pins, right angled)
pins: 1, 2, 3, 4, 5, 6, 7, 8, 9, 10, 11, 12

## WE-WR-MM Female Angled Connector with Polarization 690368171472
designator C?
WR-MM Female Angled Connector with Polarization; Manufacturer: Würth Elektronik eiSos GmbH; ComponentLink1 Description: Manufacturer; ComponentLink2 Description: Datasheet; NoPins: 14; Created Date: 18 April 2013; partNo: 690368171472; ComponentLink1URL: http://www.we-online.com; ComponentLink2URL: http://katalog.we-online.de/em/datasheet/69036817xx72.pdf; Created by: Karrer Zheng
footprint 690368171472 (without Latch, 14 pins, right angled)
pins: 1, 2, 3, 4, 5, 6, 7, 8, 9, 10, 11, 12, 13, 14

## WE-WR-MM Female Angled Connector with Polarization 690368171672
designator C?
WR-MM Female Angled Connector with Polarization; Manufacturer: Würth Elektronik eiSos GmbH; ComponentLink1 Description: Manufacturer; ComponentLink2 Description: Datasheet; NoPins: 16; Created Date: 18 April 2013; partNo: 690368171672; ComponentLink1URL: http://www.we-online.com; ComponentLink2URL: http://katalog.we-online.de/em/datasheet/69036817xx72.pdf; Created by: Karrer Zheng
footprint 690368171672 (without Latch, 16 pins, right angled)
pins: 1, 2, 3, 4, 5, 6, 7, 8, 9, 10, 11, 12, 13, 14, 15, 16

## WE-WR-MM Female Angled Connector with Polarization 690368171872
designator C?
WR-MM Female Angled Connector with Polarization; Manufacturer: Würth Elektronik eiSos GmbH; ComponentLink1 Description: Manufacturer; ComponentLink2 Description: Datasheet; NoPins: 18; Created Date: 18 April 2013; partNo: 690368171872; ComponentLink1URL: http://www.we-online.com; ComponentLink2URL: http://katalog.we-online.de/em/datasheet/69036817xx72.pdf; Created by: Karrer Zheng
footprint 690368171872 (without Latch, 18 pins, right angled)
pins: 1, 2, 3, 4, 5, 6, 7, 8, 9, 10, 11, 12, 13, 14, 15, 16, 17, 18

## WE-WR-MM Female Angled Connector with Polarization 690368172072
designator C?
WR-MM Female Angled Connector with Polarization; Manufacturer: Würth Elektronik eiSos GmbH; ComponentLink1 Description: Manufacturer; ComponentLink2 Description: Datasheet; NoPins: 20; Created Date: 18 April 2013; partNo: 690368172072; ComponentLink1URL: http://www.we-online.com; ComponentLink2URL: http://katalog.we-online.de/em/datasheet/69036817xx72.pdf; Created by: Karrer Zheng
footprint 690368172072 (without Latch, 20 pins, right angled)
pins: 1, 2, 3, 4, 5, 6, 7, 8, 9, 10, 11, 12, 13, 14, 15, 16, 17, 18, 19, 20

## WE-WR-MM Female Angled Connector with Polarization 690368172272
designator C?
WR-MM Female Angled Connector with Polarization; Manufacturer: Würth Elektronik eiSos GmbH; ComponentLink1 Description: Manufacturer; ComponentLink2 Description: Datasheet; NoPins: 22; Created Date: 18 April 2013; partNo: 690368172272; ComponentLink1URL: http://www.we-online.com; ComponentLink2URL: http://katalog.we-online.de/em/datasheet/69036817xx72.pdf; Created by: Karrer Zheng
footprint 690368172272 (without Latch, 22 pins, right angled)
pins: 1, 2, 3, 4, 5, 6, 7, 8, 9, 10, 11, 12, 13, 14, 15, 16, 17, 18, 19, 20, 21, 22

## WE-WR-MM Female Angled Connector with Polarization 690368172472
designator C?
WR-MM Female Angled Connector with Polarization; Manufacturer: Würth Elektronik eiSos GmbH; ComponentLink1 Description: Manufacturer; ComponentLink2 Description: Datasheet; NoPins: 24; Created Date: 18 April 2013; partNo: 690368172472; ComponentLink1URL: http://www.we-online.com; ComponentLink2URL: http://katalog.we-online.de/em/datasheet/69036817xx72.pdf; Created by: Karrer Zheng
footprint 690368172472 (without Latch, 24 pins, right angled)
pins: 1, 2, 3, 4, 5, 6, 7, 8, 9, 10, 11, 12, 13, 14, 15, 16, 17, 18, 19, 20, 21, 22, 23, 24

## WE-WR-MM Female Angled Connector with Polarization 690368172672
designator C?
WR-MM Female Angled Connector with Polarization; Manufacturer: Würth Elektronik eiSos GmbH; ComponentLink1 Description: Manufacturer; ComponentLink2 Description: Datasheet; NoPins: 26; Created Date: 18 April 2013; partNo: 690368172672; ComponentLink1URL: http://www.we-online.com; ComponentLink2URL: http://katalog.we-online.de/em/datasheet/69036817xx72.pdf; Created by: Karrer Zheng
footprint 690368172672 (without Latch, 26 pins, right angled)
pins: 1, 2, 3, 4, 5, 6, 7, 8, 9, 10, 11, 12, 13, 14, 15, 16, 17, 18, 19, 20, 21, 22, 23, 24, 25, 26

